# Altium footprint library Main.PcbLib: 50 footprints (part 1 of 4)
Each footprint in its own frame and in the unit in brackets; x right, y up, seen from the top. Pads: shape width x height; smd on the part's side, far side on the other; paste and mask are expansions set on the pad; w line width, h text height; cw(c..) or ccw(c..) is an arc to the next point about the centre after c.
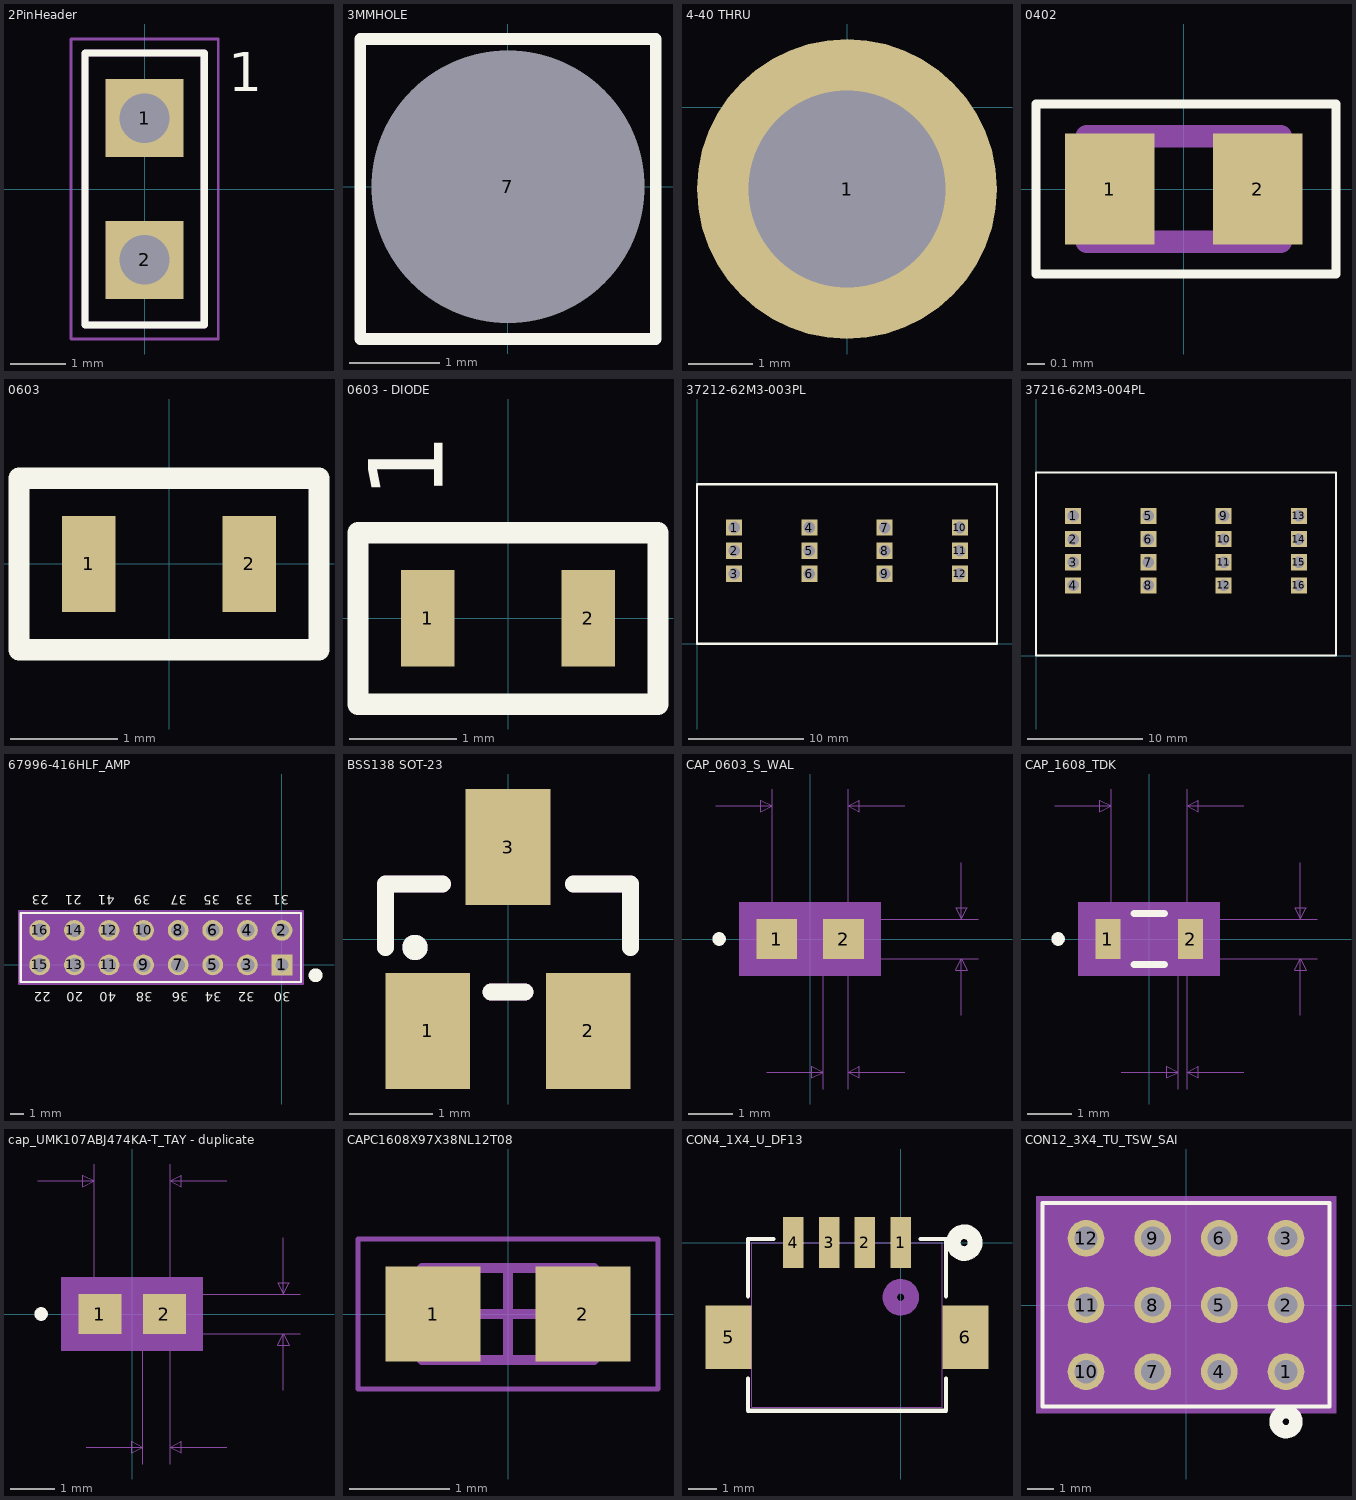
[diagram p0: the footprints below, top view; thin cyan lines are the x and y axes]

## 2PinHeader [mm]
pads (2):
  rect 1.398x1.398 hole 0.89: 1(0,1.27) 2(0,-1.27)
Top Overlay:
  lines w0.127: -1.07,-2.44 1.07,-2.44 1.07,2.44 -1.07,2.44 -1.07,-2.44
  text "1" at 1.497,1.751 h0.7
Mechanical 4:
  lines w0.127: -1.07,-2.44 -1.07,2.44 ; -1.07,-2.44 1.07,-2.44 ; -1.07,-2.44 -1.07,2.44 ; -1.07,-2.44 1.07,-2.44 ; -1.07,2.44 1.07,2.44 ; -1.07,2.44 1.07,2.44 ; 1.07,-2.44 1.07,2.44 ; 1.07,-2.44 1.07,2.44
Mechanical 16:
  lines w0.05: -1.32,-2.69 -1.32,2.69 1.32,2.69 1.32,-2.69 -1.32,-2.69
3D body "2pin.x_t": height 8.55, standoff -2.99, extent -1.27,-2.54 1.27,2.54

## 3MMHOLE [mm]
pads (1):
  round 1 hole 3: 7(0,0)
Top Overlay:
  lines w0.127: -1.626,-1.676 -1.626,1.626 1.626,1.626 1.626,-1.676 -1.626,-1.676

## 4-40 THRU [mil]
pads (1):
  round 183 hole 120: 1(0,-50)

## 0402 [mm]
pads (2):
  rect 0.508x0.63 smd: 1(-0.42,0) 2(0.42,0)
Top Overlay:
  lines w0.05: -0.838,-0.483 -0.838,0.483 0.864,0.483 0.864,-0.483 -0.838,-0.483
Mechanical 4:
  lines w0.127: -0.55,-0.3 -0.55,0.3 ; -0.55,-0.3 0.55,-0.3 ; -0.55,-0.3 -0.55,0.3 ; -0.55,-0.3 0.55,-0.3 ; -0.55,0.3 0.55,0.3 ; -0.55,0.3 0.55,0.3 ; 0.55,-0.3 0.55,0.3 ; 0.55,-0.3 0.55,0.3
3D body "C0402.STEP": height 0.51, standoff 0.01, extent -0.5,-0.281 0.5,0.279

## 0603 [mm]
pads (2):
  rect 0.5x0.9 smd: 1(-0.75,0) 2(0.75,0)
Top Overlay:
  lines w0.2: -1.4,-0.8 -1.4,0 -1.4,0.8 1.4,0.8 1.4,-0.8 -1.4,-0.8
3D body "C0603.step": height 0.81, standoff 0.01, extent -0.8,-0.4 0.8,0.4

## 0603 - DIODE [mm]
pads (2):
  rect 0.5x0.9 smd: 1(-0.75,0) 2(0.75,0)
Top Overlay:
  lines w0.2: -1.4,-0.8 -1.4,0 -1.4,0.8 1.4,0.8 1.4,-0.8 -1.4,-0.8
  text "1" at -0.608,1.116 h0.7
3D body "APG1608.sldprt": height 0.26, standoff 0.01, extent -0.8,-0.4 0.8,0.4

## 37212-62M3-003PL [mm]
pads (12):
  rect 1.398x1.398 hole 1: 1(3.2,10.05) 2(3.2,8.05) 3(3.2,6.05) 4(9.7,10.05) 5(9.7,8.05) 6(9.7,6.05) 7(16.2,10.05) 8(16.2,8.05) 9(16.2,6.05) 10(22.7,10.05) 11(22.7,8.05) 12(22.7,6.05)
Top Overlay:
  lines w0.203: 0,0 0,13.8 25.9,13.8 25.9,0 0,0
3D body "37212-62M3-003 PL_STEP.stp": height 13.01, standoff -2.59, extent -0.023,-0.095 25.877,13.705

## 37216-62M3-004PL [mm]
pads (16):
  rect 1.398x1.398 hole 1: 1(3.2,12.05) 2(3.2,10.05) 3(3.2,8.05) 4(3.2,6.05) 5(9.7,12.05) 6(9.7,10.05) 7(9.7,8.05) 8(9.7,6.05) 9(16.2,12.05) 10(16.2,10.05) 11(16.2,8.05) 12(16.2,6.05) 13(22.7,12.05) 14(22.7,10.05) 15(22.7,8.05) 16(22.7,6.05)
Top Overlay:
  lines w0.203: 0,0 0,15.8 25.9,15.8 25.9,0 0,0
3D body "37216-62M3-004 PL_step.stp": height 13.01, standoff -2.59, extent 0.004,-0.052 25.904,15.748

## 67996-416HLF_AMP [mil]
pads (16):
  rect 60x60 hole 38 mask+0: 1(0,0)
  round 60 hole 40 mask+0: 2(0,100) 3(-100,0) 4(-100,100) 5(-200,0) 6(-200,100) 7(-300,0) 8(-300,100) 9(-400,0) 10(-400,100) 11(-500,0) 12(-500,100) 13(-600,0) 14(-600,100) 15(-700,0) 16(-700,100)
Top Overlay:
  circle w20: c97,-30 r10
  lines w6: -755,-50 -755,150 55,150 55,-50 -755,-50
  text "30" at 26.06,-78.94 h27.56
  text "32" at -78.94,-78.94 h27.56
  text "34" at -173.94,-78.94 h27.56
  text "36" at -268.94,-78.94 h27.56
  text "38" at -373.94,-78.94 h27.56
  text "40" at -478.94,-78.94 h27.56
  text "20" at -573.94,-78.94 h27.56
  text "22" at -668.94,-78.94 h27.56
  text "31" at 21.06,201.06 h27.56
  text "33" at -83.94,201.06 h27.56
  text "35" at -178.94,201.06 h27.56
  text "37" at -273.94,201.06 h27.56
  text "39" at -378.94,201.06 h27.56
  text "41" at -483.94,201.06 h27.56
  text "21" at -578.94,201.06 h27.56
  text "23" at -673.94,201.06 h27.56
Mechanical 1:
  text "'.Designator'String" at -731.06,-31.88 h27.56
Mechanical 5:
  region: 57.5,-52.5 -757.5,-52.5 -757.5,152.5 57.5,152.5
Mechanical 13:
  circle w0: c0,-30 r10
  lines w1: -750,-45 -750,145 50,145 50,-45 -750,-45
Mechanical 15:
  region: 60,155 -760,155 -760,-55 60,-55
  lines w6: -760,-55 60,-55 60,155 -760,155 -760,-55
3D body: height 10, standoff 0, extent 0,0 10,10

## BSS138 SOT-23 [mil]
pads (3):
  rect 40x55 smd: 1(-38,-43.5) 2(38,-43.5) 3(0,43.5)
Top Overlay:
  circle w10: c-44,-4 r1
  lines w8: -58,-4 -58,26 -31,26 ; -8,-25 8,-25 ; 31,26 58,26 58,-4
Mechanical 29:
  circle w10: c-44,-4 r1
  lines w8: -58,-4 -58,26 -31,26 ; -8,-25 8,-25 ; 31,26 58,26 58,-4
  text "'.Designator'" at -33,-11.34 h20
3D body "SOT-23_3L_ONS.step": height 44.09, standoff 0, extent -60,-52 60,52.01

## CAP_0603_S_WAL [mil]
pads (2):
  rect 36x35 smd paste+0 mask+0: 1(-29.5,0) 2(29.5,0)
Top Overlay:
  circle w6: c-80.5,0 r3
Mechanical 5:
  region: 62.5,-32.5 -62.5,-32.5 -62.5,32.5 62.5,32.5
Mechanical 7:
  lines w1: -83.5,117.5 -33.5,117.5 ; -38.5,-117.5 11.5,-117.5 ; -33.5,0 -33.5,132.5 ; 0,-17.5 148.5,-17.5 ; 0,17.5 148.5,17.5 ; 11.5,-132.5 11.5,0 ; 33.5,-132.5 33.5,0 33.5,132.5 ; 83.5,-117.5 33.5,-117.5 ; 83.5,117.5 33.5,117.5 ; 133.5,-67.5 133.5,-17.5 ; 133.5,67.5 133.5,17.5 ; -33.5,117.5 -43.5,122.5 -43.5,112.5 -33.5,117.5 ; 11.5,-117.5 1.5,-112.5 1.5,-122.5 11.5,-117.5 ; 33.5,-117.5 43.5,-112.5 43.5,-122.5 33.5,-117.5 ; 33.5,117.5 43.5,122.5 43.5,112.5 33.5,117.5 ; 133.5,-17.5 128.5,-27.5 138.5,-27.5 133.5,-17.5 ; 133.5,17.5 128.5,27.5 138.5,27.5 133.5,17.5
  text "Default Padstyle: RX36Y35D0T" at -350,-287.5 h50
  text "Alternate 1 Padstyle: OX60Y90D30P" at -412.5,-387.5 h50
  text "Alternate 2 Padstyle: OX90Y60D30P" at -412.5,-487.5 h50
  text "0.035in/0.889mm" at 153.5,-12.5 h25
  text "0.067in/1.702mm" at -93.75,137.5 h25
  text "0.022in/0.559mm" at -71.25,-162.5 h25
Mechanical 13:
  circle w0: c-23.5,0 r3
  lines w1: -33.5,-17.5 -33.5,17.5 ; -33.5,-17.5 -11.5,-17.5 -11.5,17.5 -33.5,17.5 ; -33.5,-17.5 33.5,-17.5 ; -33.5,-17.5 -33.5,17.5 ; -33.5,17.5 33.5,17.5 ; 33.5,-17.5 11.5,-17.5 11.5,17.5 33.5,17.5 ; 33.5,-17.5 33.5,17.5 ; 33.5,-17.5 33.5,17.5
Mechanical 15:
  region: 57.5,-27.5 -57.5,-27.5 -57.5,27.5 57.5,27.5
  lines w6: -57.5,-27.5 -57.5,27.5 57.5,27.5 57.5,-27.5 -57.5,-27.5
3D body: height 10, standoff 0, extent 0,0 10,10

## CAP_1608_TDK [mil]
pads (2):
  rect 22x35 smd paste+0 mask+0: 1(-36.5,0) 2(36.5,0)
Top Overlay:
  circle w6: c-80.5,0 r3
  lines w6: -13.39,-22.5 13.39,-22.5 ; -13.39,22.5 13.39,22.5
Mechanical 5:
  region: 62.5,-32.5 -62.5,-32.5 -62.5,32.5 62.5,32.5
Mechanical 7:
  lines w1: -83.5,117.5 -33.5,117.5 ; -33.5,0 -33.5,132.5 ; -24.5,-117.5 25.5,-117.5 ; 0,-17.5 148.5,-17.5 ; 0,17.5 148.5,17.5 ; 25.5,-132.5 25.5,0 ; 33.5,-132.5 33.5,0 33.5,132.5 ; 83.5,-117.5 33.5,-117.5 ; 83.5,117.5 33.5,117.5 ; 133.5,-67.5 133.5,-17.5 ; 133.5,67.5 133.5,17.5 ; -33.5,117.5 -43.5,112.5 -43.5,122.5 -33.5,117.5 ; 25.5,-117.5 15.5,-122.5 15.5,-112.5 25.5,-117.5 ; 33.5,-117.5 43.5,-122.5 43.5,-112.5 33.5,-117.5 ; 33.5,117.5 43.5,112.5 43.5,122.5 33.5,117.5 ; 133.5,-17.5 138.5,-27.5 128.5,-27.5 133.5,-17.5 ; 133.5,17.5 138.5,27.5 128.5,27.5 133.5,17.5
  text "0.008in/0.203mm" at -64.25,-162.5 h25
  text "0.067in/1.702mm" at -93.75,137.5 h25
  text "0.035in/0.889mm" at 153.5,-12.5 h25
  text "Alternate 2 Padstyle: OX90Y60D30P" at -412.5,-487.5 h50
  text "Alternate 1 Padstyle: OX60Y90D30P" at -412.5,-387.5 h50
  text "Default Padstyle: RX22Y35D0T" at -350,-287.5 h50
Mechanical 13:
  circle w0: c-31.5,0 r3
  lines w1: -33.5,-17.5 -33.5,17.5 ; -33.5,-17.5 33.5,-17.5 ; -33.5,-17.5 -25.5,-17.5 -25.5,17.5 -33.5,17.5 ; -33.5,-17.5 -33.5,17.5 ; -33.5,17.5 33.5,17.5 ; 33.5,-17.5 33.5,17.5 ; 33.5,-17.5 33.5,17.5 ; 33.5,-17.5 25.5,-17.5 25.5,17.5 33.5,17.5
Mechanical 15:
  region: 57.5,-27.5 -57.5,-27.5 -57.5,27.5 57.5,27.5
  lines w6: -57.5,-27.5 57.5,-27.5 57.5,27.5 -57.5,27.5 -57.5,-27.5
3D body: height 10, standoff 0, extent 0,0 10,10

## cap_UMK107ABJ474KA-T_TAY - duplicate [mil]
pads (2):
  rect 38x35 smd paste+0 mask+0: 1(-28.5,0) 2(28.5,0)
Top Overlay:
  circle w6: c-80.5,0 r3
Mechanical 5:
  region: 62.5,-32.5 -62.5,-32.5 -62.5,32.5 62.5,32.5
Mechanical 7:
  lines w1: -83.5,117.5 -33.5,117.5 ; -40.5,-117.5 9.5,-117.5 ; -33.5,0 -33.5,132.5 ; 0,-17.5 148.5,-17.5 ; 0,17.5 148.5,17.5 ; 9.5,-132.5 9.5,0 ; 33.5,-132.5 33.5,0 33.5,132.5 ; 83.5,-117.5 33.5,-117.5 ; 83.5,117.5 33.5,117.5 ; 133.5,-67.5 133.5,-17.5 ; 133.5,67.5 133.5,17.5 ; -33.5,117.5 -43.5,112.5 -43.5,122.5 -33.5,117.5 ; 9.5,-117.5 -0.5,-122.5 -0.5,-112.5 9.5,-117.5 ; 33.5,-117.5 43.5,-122.5 43.5,-112.5 33.5,-117.5 ; 33.5,117.5 43.5,112.5 43.5,122.5 33.5,117.5 ; 133.5,-17.5 138.5,-27.5 128.5,-27.5 133.5,-17.5 ; 133.5,17.5 138.5,27.5 128.5,27.5 133.5,17.5
  text "0.024in/0.61mm" at -66,-162.5 h25
  text "0.067in/1.702mm" at -93.75,137.5 h25
  text "0.035in/0.889mm" at 153.5,-12.5 h25
  text "Alternate 2 Padstyle: OX90Y60D30P" at -412.5,-487.5 h50
  text "Alternate 1 Padstyle: OX60Y90D30P" at -412.5,-387.5 h50
  text "Default Padstyle: RX38Y35D0T" at -350,-287.5 h50
Mechanical 13:
  circle w0: c-23.5,0 r3
  lines w1: -33.5,-17.5 -33.5,17.5 ; -33.5,-17.5 33.5,-17.5 ; -33.5,-17.5 -9.5,-17.5 -9.5,17.5 -33.5,17.5 ; -33.5,-17.5 -33.5,17.5 ; -33.5,17.5 33.5,17.5 ; 33.5,-17.5 33.5,17.5 ; 33.5,-17.5 33.5,17.5 ; 33.5,-17.5 9.5,-17.5 9.5,17.5 33.5,17.5
Mechanical 15:
  region: 57.5,-27.5 -57.5,-27.5 -57.5,27.5 57.5,27.5
  lines w6: -57.5,-27.5 57.5,-27.5 57.5,27.5 -57.5,27.5 -57.5,-27.5
3D body: height 10, standoff 0, extent 0,0 10,10

## CAPC1608X97X38NL12T08 [mm]
pads (2):
  rect 0.95x0.95 smd: 1(-0.75,0) 2(0.75,0)
Mechanical 13:
  lines w0.1: -0.86,-0.46 0.86,-0.46 0.86,0.46 -0.86,0.46 -0.86,-0.46
Mechanical 15:
  lines w0.05: -1.5,-0.75 1.5,-0.75 1.5,0.75 -1.5,0.75 -1.5,-0.75
  lines w0.1: -0.46,0 0.46,0 ; 0,-0.46 0,0.46
3D body: height 0.97, standoff 0, extent 0.48,-0.46 0.86,0.46
3D body: height 0.97, standoff 0, extent -0.86,-0.46 -0.48,0.46
3D body: height 0.97, standoff 0, extent -0.48,-0.46 0.48,0.46

## CON4_1X4_U_DF13 [mil]
pads (6):
  rect 28x70 smd: 1(0,0) 2(-49.21,0) 3(-98.43,0) 4(-147.64,0)
  rect 63x87 smd: 5(-236.32,-130) 6(88.68,-130)
Top Overlay:
  circle w20: c87.18,0 r15
  lines w6: -209.82,-186.6 -209.82,-231 62.18,-231 62.18,-186.6 ; -209.82,-73.4 -209.82,5 -174.74,5 ; 27.1,5 62.18,5 62.18,-73.4
Bottom Overlay:
  circle w20: c87.18,0 r15
Mechanical 13:
  circle w20: c0,-75 r15
  lines w1: -204.82,-226 -204.82,0 57.18,0 57.18,-226 -204.82,-226
3D body "depthcon.x_t": height 189.48, standoff 0.5, extent -262,-197 117.92,-4.09

## CON12_3X4_TU_TSW_SAI [mil]
pads (12):
  round 55 hole 35 mask+0: 1(150,-100) 2(150,0) 3(150,100) 4(50,-100) 5(50,0) 6(50,100) 7(-50,-100) 8(-50,0) 9(-50,100) 10(-150,-100) 11(-150,0) 12(-150,100)
Top Overlay:
  circle w20: c150,-175 r15
  lines w6: -215,-152 215,-152 215,153 -215,153 -215,-152
Bottom Overlay:
  circle w20: c150,-175 r15
Mechanical 5:
  region: -225,163 225,163 225,-162 -225,-162
Mechanical 13:
  circle w0: c150,-100 r10
  lines w1: -210,-147 210,-147 210,148 -210,148 -210,-147
Mechanical 15:
  region: 220,158 187.5,158 -187.5,158 -220,158 -220,-157 -187.5,-157 187.5,-157 220,-157
  lines w6: -220,-157 -220,158 -187.5,158 187.5,158 220,158 220,-157 187.5,-157 -187.5,-157 -220,-157
3D body: height 10, standoff 0, extent 0,0 10,10